# Altium integrated library Header-254mm.IntLib: 172 symbols
Pins are listed as number, name and electrical type; pins without a type are passive.

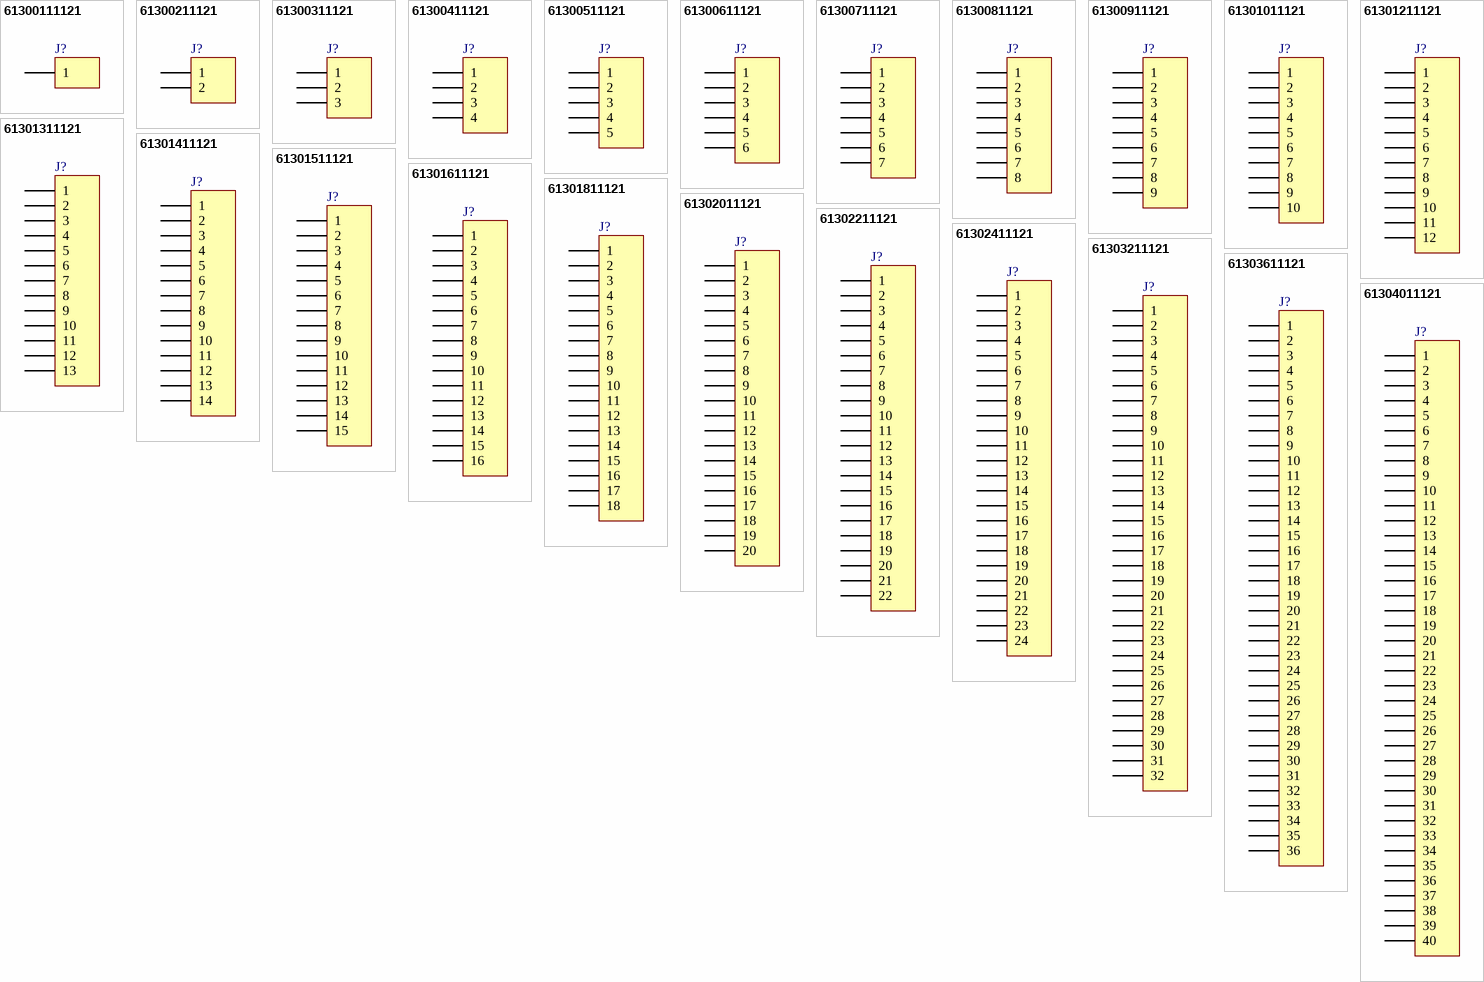
[diagram p0: symbols 61300111121 to 61304011121]

## 61300111121
designator J?, comment 01p  (value not drawn)
WR-PHD 2.54 mm THT Pin Header, 01p; Part Number: 61300111121; Vendor: Wurth Elektronik; Value: 01p
footprint 61300111121
pins: 1

## 61300211121
designator J?, comment 02p  (value not drawn)
WR-PHD 2.54 mm THT Pin Header, 02p; Part Number: 61300211121; Vendor: Wurth Elektronik; Value: 02p
footprint 61300211121
pins: 1, 2

## 61300311121
designator J?, comment 03p  (value not drawn)
WR-PHD 2.54 mm THT Pin Header, 03p; Part Number: 61300311121; Vendor: Wurth Elektronik; Value: 03p
footprint 61300311121
pins: 1, 2, 3

## 61300411121
designator J?, comment 04p  (value not drawn)
WR-PHD 2.54 mm THT Pin Header, 04p; Part Number: 61300411121; Vendor: Wurth Elektronik; Value: 04p
footprint 61300411121
pins: 1, 2, 3, 4

## 61300511121
designator J?, comment 05p  (value not drawn)
WR-PHD 2.54 mm THT Pin Header, 05p; Part Number: 61300511121; Vendor: Wurth Elektronik; Value: 05p
footprint 61300511121
pins: 1, 2, 3, 4, 5

## 61300611121
designator J?, comment 06p  (value not drawn)
WR-PHD 2.54 mm THT Pin Header, 06p; Part Number: 61300611121; Vendor: Wurth Elektronik; Value: 06p
footprint 61300611121
pins: 1, 2, 3, 4, 5, 6

## 61300711121
designator J?, comment 07p  (value not drawn)
WR-PHD 2.54 mm THT Pin Header, 07p; Part Number: 61300711121; Vendor: Wurth Elektronik; Value: 07p
footprint 61300711121
pins: 1, 2, 3, 4, 5, 6, 7

## 61300811121
designator J?, comment 08p  (value not drawn)
WR-PHD 2.54 mm THT Pin Header, 08p; Part Number: 61300811121; Vendor: Wurth Elektronik; Value: 08p
footprint 61300811121
pins: 1, 2, 3, 4, 5, 6, 7, 8

## 61300911121
designator J?, comment 09p  (value not drawn)
WR-PHD 2.54 mm THT Pin Header, 09p; Part Number: 61300911121; Vendor: Wurth Elektronik; Value: 09p
footprint 61300911121
pins: 1, 2, 3, 4, 5, 6, 7, 8, 9

## 61301011121
designator J?, comment 10p  (value not drawn)
WR-PHD 2.54 mm THT Pin Header, 10p; Part Number: 61301011121; Vendor: Wurth Elektronik; Value: 10p
footprint 61301011121
pins: 1, 2, 3, 4, 5, 6, 7, 8, 9, 10

## 61301211121
designator J?, comment 12p  (value not drawn)
WR-PHD 2.54 mm THT Pin Header, 12p; Part Number: 61301211121; Vendor: Wurth Elektronik; Value: 12p
footprint 61301211121
pins: 1, 2, 3, 4, 5, 6, 7, 8, 9, 10, 11, 12

## 61301311121
designator J?, comment 13p  (value not drawn)
WR-PHD 2.54 mm THT Pin Header, 13p; Part Number: 61301311121; Vendor: Wurth Elektronik; Value: 13p
footprint 61301311121
pins: 1, 2, 3, 4, 5, 6, 7, 8, 9, 10, 11, 12, 13

## 61301411121
designator J?, comment 14p  (value not drawn)
WR-PHD 2.54 mm THT Pin Header, 14p; Part Number: 61301411121; Vendor: Wurth Elektronik; Value: 14p
footprint 61301411121
pins: 1, 2, 3, 4, 5, 6, 7, 8, 9, 10, 11, 12, 13, 14

## 61301511121
designator J?, comment 15p  (value not drawn)
WR-PHD 2.54 mm THT Pin Header, 15p; Part Number: 61301511121; Vendor: Wurth Elektronik; Value: 15p
footprint 61301511121
pins: 1, 2, 3, 4, 5, 6, 7, 8, 9, 10, 11, 12, 13, 14, 15

## 61301611121
designator J?, comment 16p  (value not drawn)
WR-PHD 2.54 mm THT Pin Header, 16p; Part Number: 61301611121; Vendor: Wurth Elektronik; Value: 16p
footprint 61301611121
pins: 1, 2, 3, 4, 5, 6, 7, 8, 9, 10, 11, 12, 13, 14, 15, 16

## 61301811121
designator J?, comment 18p  (value not drawn)
WR-PHD 2.54 mm THT Pin Header, 18p; Part Number: 61301811121; Vendor: Wurth Elektronik; Value: 18p
footprint 61301811121
pins: 1, 2, 3, 4, 5, 6, 7, 8, 9, 10, 11, 12, 13, 14, 15, 16, 17, 18

## 61302011121
designator J?, comment 20p  (value not drawn)
WR-PHD 2.54 mm THT Pin Header, 20p; Part Number: 61302011121; Vendor: Wurth Elektronik; Value: 20p
footprint 61302011121
pins: 1, 2, 3, 4, 5, 6, 7, 8, 9, 10, 11, 12, 13, 14, 15, 16, 17, 18, 19, 20

## 61302211121
designator J?, comment 22p  (value not drawn)
WR-PHD 2.54 mm THT Pin Header, 22p; Part Number: 61302211121; Vendor: Wurth Elektronik; Value: 22p
footprint 61302211121
pins: 1, 2, 3, 4, 5, 6, 7, 8, 9, 10, 11, 12, 13, 14, 15, 16, 17, 18, 19, 20, 21, 22

## 61302411121
designator J?, comment 24p  (value not drawn)
WR-PHD 2.54 mm THT Pin Header, 24p; Part Number: 61302411121; Vendor: Wurth Elektronik; Value: 24p
footprint 61302411121
pins: 1, 2, 3, 4, 5, 6, 7, 8, 9, 10, 11, 12, 13, 14, 15, 16, 17, 18, 19, 20, 21, 22, 23, 24

## 61303211121
designator J?, comment 32p  (value not drawn)
WR-PHD 2.54 mm THT Pin Header, 32p; Part Number: 61303211121; Vendor: Wurth Elektronik; Value: 32p
footprint 61303211121
pins: 1, 2, 3, 4, 5, 6, 7, 8, 9, 10, 11, 12, 13, 14, 15, 16, 17, 18, 19, 20, 21, 22, 23, 24, 25, 26, 27, 28, 29, 30, 31, 32

## 61303611121
designator J?, comment 36p  (value not drawn)
WR-PHD 2.54 mm THT Pin Header, 36p; Part Number: 61303611121; Vendor: Wurth Elektronik; Value: 36p
footprint 61303611121
pins: 1, 2, 3, 4, 5, 6, 7, 8, 9, 10, 11, 12, 13, 14, 15, 16, 17, 18, 19, 20, 21, 22, 23, 24, 25, 26, 27, 28, 29, 30, 31, 32, 33, 34, 35, 36

## 61304011121
designator J?, comment 40p  (value not drawn)
WR-PHD 2.54 mm THT Pin Header, 40p; Part Number: 61304011121; Vendor: Wurth Elektronik; Value: 40p
footprint 61304011121
pins: 1, 2, 3, 4, 5, 6, 7, 8, 9, 10, 11, 12, 13, 14, 15, 16, 17, 18, 19, 20, 21, 22, 23, 24, 25, 26, 27, 28, 29, 30, 31, 32, 33, 34, 35, 36, 37, 38, 39, 40


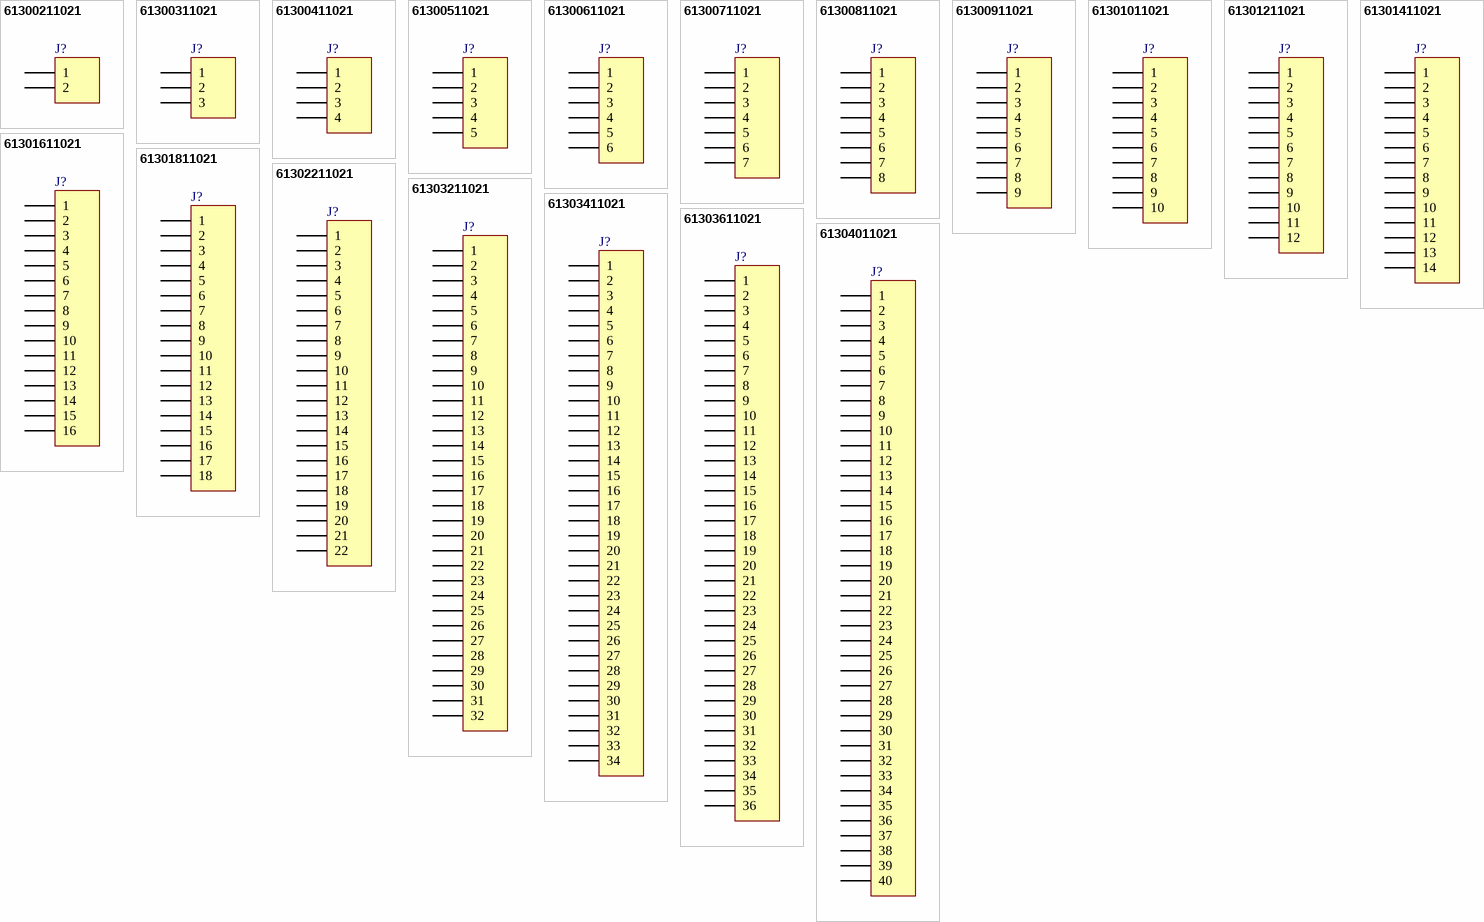
[diagram p1: symbols 61300211021 to 61304011021]

## 61300211021
designator J?, comment 02p  (value not drawn)
WR-PHD 2.54 mm THT Angled Pin Header, 02p; Part Number: 61300211021; Vendor: Wurth Elektronik; Value: 02p
footprint 61300211021
pins: 1, 2

## 61300311021
designator J?, comment 03p  (value not drawn)
WR-PHD 2.54 mm THT Angled Pin Header, 03p; Part Number: 61300311021; Vendor: Wurth Elektronik; Value: 03p
footprint 61300311021
pins: 1, 2, 3

## 61300411021
designator J?, comment 04p  (value not drawn)
WR-PHD 2.54 mm THT Angled Pin Header, 04p; Part Number: 61300411021; Vendor: Wurth Elektronik; Value: 04p
footprint 61300411021
pins: 1, 2, 3, 4

## 61300511021
designator J?, comment 05p  (value not drawn)
WR-PHD 2.54 mm THT Angled Pin Header, 05p; Part Number: 61300511021; Vendor: Wurth Elektronik; Value: 05p
footprint 61300511021
pins: 1, 2, 3, 4, 5

## 61300611021
designator J?, comment 06p  (value not drawn)
WR-PHD 2.54 mm THT Angled Pin Header, 06p; Part Number: 61300611021; Vendor: Wurth Elektronik; Value: 06p
footprint 61300611021
pins: 1, 2, 3, 4, 5, 6

## 61300711021
designator J?, comment 07p  (value not drawn)
WR-PHD 2.54 mm THT Angled Pin Header, 07p; Part Number: 61300711021; Vendor: Wurth Elektronik; Value: 07p
footprint 61300711021
pins: 1, 2, 3, 4, 5, 6, 7

## 61300811021
designator J?, comment 08p  (value not drawn)
WR-PHD 2.54 mm THT Angled Pin Header, 08p; Part Number: 61300811021; Vendor: Wurth Elektronik; Value: 08p
footprint 61300811021
pins: 1, 2, 3, 4, 5, 6, 7, 8

## 61300911021
designator J?, comment 09p  (value not drawn)
WR-PHD 2.54 mm THT Angled Pin Header, 09p; Part Number: 61300911021; Vendor: Wurth Elektronik; Value: 09p
footprint 61300911021
pins: 1, 2, 3, 4, 5, 6, 7, 8, 9

## 61301011021
designator J?, comment 10p  (value not drawn)
WR-PHD 2.54 mm THT Angled Pin Header, 10p; Part Number: 61301011021; Vendor: Wurth Elektronik; Value: 10p
footprint 61301011021
pins: 1, 2, 3, 4, 5, 6, 7, 8, 9, 10

## 61301211021
designator J?, comment 12p  (value not drawn)
WR-PHD 2.54 mm THT Angled Pin Header, 12p; Part Number: 61301211021; Vendor: Wurth Elektronik; Value: 12p
footprint 61301211021
pins: 1, 2, 3, 4, 5, 6, 7, 8, 9, 10, 11, 12

## 61301411021
designator J?, comment 14p  (value not drawn)
WR-PHD 2.54 mm THT Angled Pin Header, 14p; Part Number: 61301411021; Vendor: Wurth Elektronik; Value: 14p
footprint 61301411021
pins: 1, 2, 3, 4, 5, 6, 7, 8, 9, 10, 11, 12, 13, 14

## 61301611021
designator J?, comment 16p  (value not drawn)
WR-PHD 2.54 mm THT Angled Pin Header, 16p; Part Number: 61301611021; Vendor: Wurth Elektronik; Value: 16p
footprint 61301611021
pins: 1, 2, 3, 4, 5, 6, 7, 8, 9, 10, 11, 12, 13, 14, 15, 16

## 61301811021
designator J?, comment 18p  (value not drawn)
WR-PHD 2.54 mm THT Angled Pin Header, 18p; Part Number: 61301811021; Vendor: Wurth Elektronik; Value: 18p
footprint 61301811021
pins: 1, 2, 3, 4, 5, 6, 7, 8, 9, 10, 11, 12, 13, 14, 15, 16, 17, 18

## 61302211021
designator J?, comment 22p  (value not drawn)
WR-PHD 2.54 mm THT Angled Pin Header, 22p; Part Number: 61302211021; Vendor: Wurth Elektronik; Value: 22p
footprint 61302211021
pins: 1, 2, 3, 4, 5, 6, 7, 8, 9, 10, 11, 12, 13, 14, 15, 16, 17, 18, 19, 20, 21, 22

## 61303211021
designator J?, comment 32p  (value not drawn)
WR-PHD 2.54 mm THT Angled Pin Header, 32p; Part Number: 61303211021; Vendor: Wurth Elektronik; Value: 32p
footprint 61303211021
pins: 1, 2, 3, 4, 5, 6, 7, 8, 9, 10, 11, 12, 13, 14, 15, 16, 17, 18, 19, 20, 21, 22, 23, 24, 25, 26, 27, 28, 29, 30, 31, 32

## 61303411021
designator J?, comment 34p  (value not drawn)
WR-PHD 2.54 mm THT Angled Pin Header, 34p; Part Number: 61303411021; Vendor: Wurth Elektronik; Value: 34p
footprint 61303411021
pins: 1, 2, 3, 4, 5, 6, 7, 8, 9, 10, 11, 12, 13, 14, 15, 16, 17, 18, 19, 20, 21, 22, 23, 24, 25, 26, 27, 28, 29, 30, 31, 32, 33, 34

## 61303611021
designator J?, comment 36p  (value not drawn)
WR-PHD 2.54 mm THT Angled Pin Header, 36p; Part Number: 61303611021; Vendor: Wurth Elektronik; Value: 36p
footprint 61303611021
pins: 1, 2, 3, 4, 5, 6, 7, 8, 9, 10, 11, 12, 13, 14, 15, 16, 17, 18, 19, 20, 21, 22, 23, 24, 25, 26, 27, 28, 29, 30, 31, 32, 33, 34, 35, 36

## 61304011021
designator J?, comment 40p  (value not drawn)
WR-PHD 2.54 mm THT Angled Pin Header, 40p; Part Number: 61304011021; Vendor: Wurth Elektronik; Value: 40p
footprint 61304011021
pins: 1, 2, 3, 4, 5, 6, 7, 8, 9, 10, 11, 12, 13, 14, 15, 16, 17, 18, 19, 20, 21, 22, 23, 24, 25, 26, 27, 28, 29, 30, 31, 32, 33, 34, 35, 36, 37, 38, 39, 40


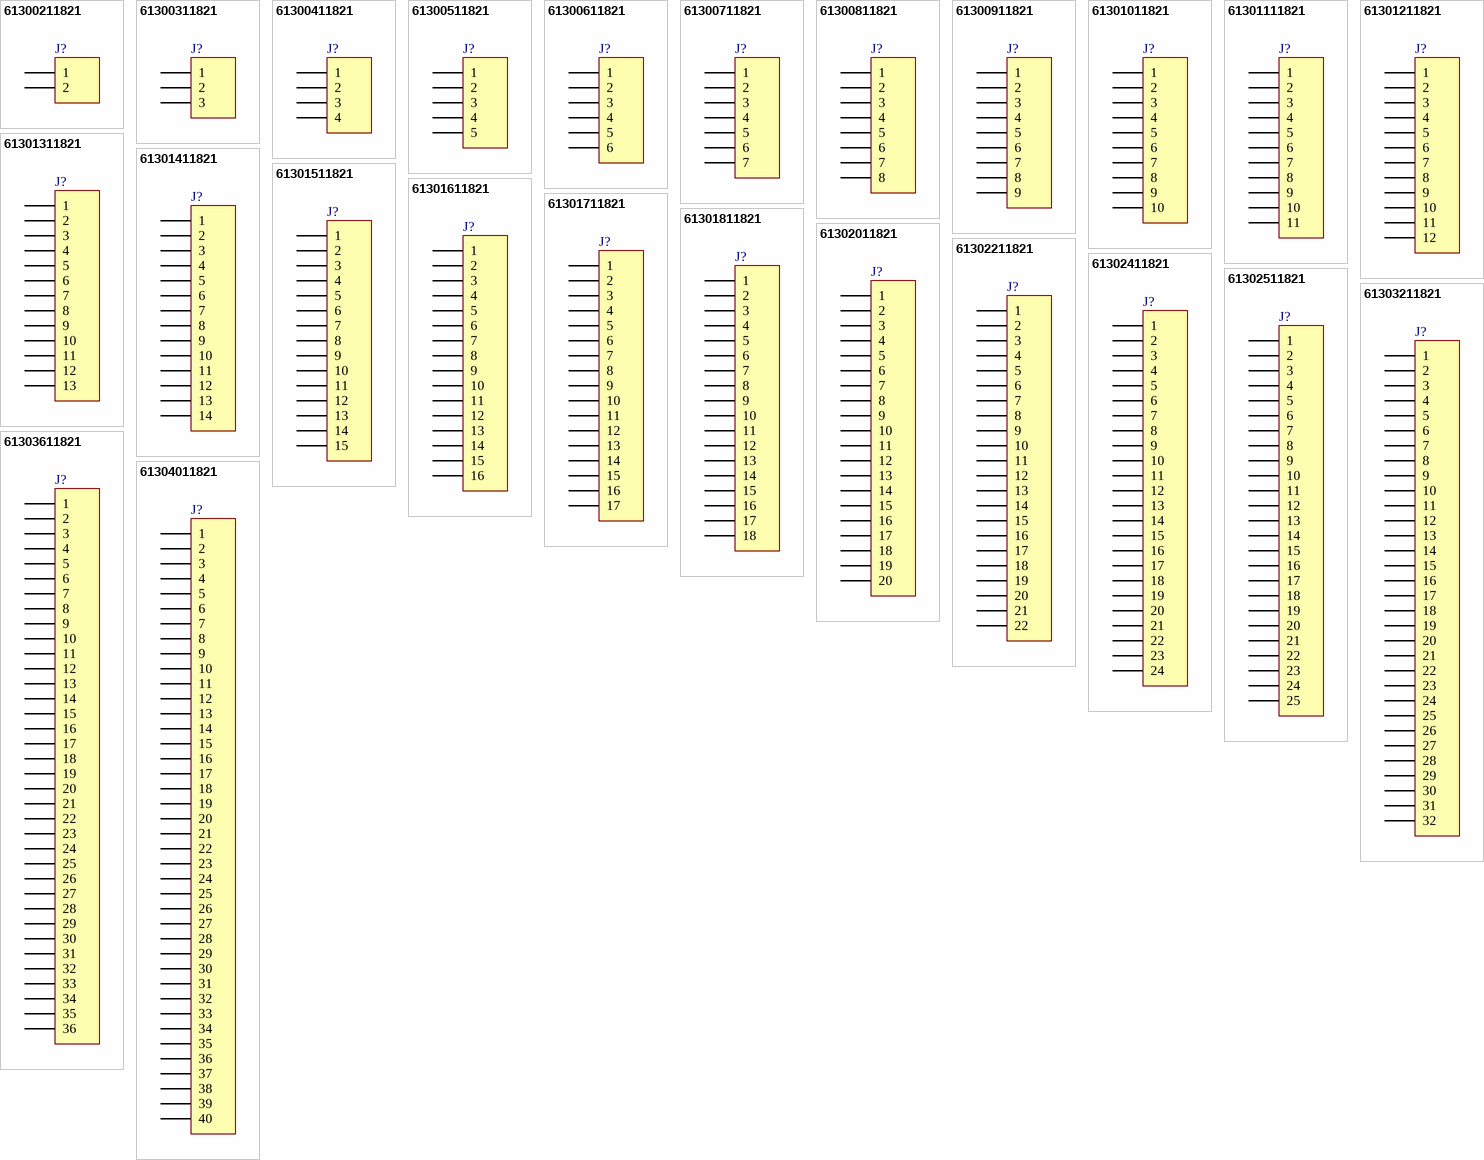
[diagram p2: symbols 61300211821 to 61304011821]

## 61300211821
designator J?, comment 02p  (value not drawn)
WR-PHD 2.54 mm Socket Header, 02p; Part Number: 61300211821; Vendor: Wurth Elektronik; Value: 02p
footprint 61300211821
pins: 1, 2

## 61300311821
designator J?, comment 03p  (value not drawn)
WR-PHD 2.54 mm Socket Header, 03p; Part Number: 61300311821; Vendor: Wurth Elektronik; Value: 03p
footprint 61300311821
pins: 1, 2, 3

## 61300411821
designator J?, comment 04p  (value not drawn)
WR-PHD 2.54 mm Socket Header, 04p; Part Number: 61300411821; Vendor: Wurth Elektronik; Value: 04p
footprint 61300411821
pins: 1, 2, 3, 4

## 61300511821
designator J?, comment 05p  (value not drawn)
WR-PHD 2.54 mm Socket Header, 05p; Part Number: 61300511821; Vendor: Wurth Elektronik; Value: 05p
footprint 61300511821
pins: 1, 2, 3, 4, 5

## 61300611821
designator J?, comment 06p  (value not drawn)
WR-PHD 2.54 mm Socket Header, 06p; Part Number: 61300611821; Vendor: Wurth Elektronik; Value: 06p
footprint 61300611821
pins: 1, 2, 3, 4, 5, 6

## 61300711821
designator J?, comment 07p  (value not drawn)
WR-PHD 2.54 mm Socket Header, 07p; Part Number: 61300711821; Vendor: Wurth Elektronik; Value: 07p
footprint 61300711821
pins: 1, 2, 3, 4, 5, 6, 7

## 61300811821
designator J?, comment 08p  (value not drawn)
WR-PHD 2.54 mm Socket Header, 08p; Part Number: 61300811821; Vendor: Wurth Elektronik; Value: 08p
footprint 61300811821
pins: 1, 2, 3, 4, 5, 6, 7, 8

## 61300911821
designator J?, comment 09p  (value not drawn)
WR-PHD 2.54 mm Socket Header, 09p; Part Number: 61300911821; Vendor: Wurth Elektronik; Value: 09p
footprint 61300911821
pins: 1, 2, 3, 4, 5, 6, 7, 8, 9

## 61301011821
designator J?, comment 10p  (value not drawn)
WR-PHD 2.54 mm Socket Header, 10p; Part Number: 61301011821; Vendor: Wurth Elektronik; Value: 10p
footprint 61301011821
pins: 1, 2, 3, 4, 5, 6, 7, 8, 9, 10

## 61301111821
designator J?, comment 11p  (value not drawn)
WR-PHD 2.54 mm Socket Header, 11p; Part Number: 61301111821; Vendor: Wurth Elektronik; Value: 11p
footprint 61301111821
pins: 1, 2, 3, 4, 5, 6, 7, 8, 9, 10, 11

## 61301211821
designator J?, comment 12p  (value not drawn)
WR-PHD 2.54 mm Socket Header, 12p; Part Number: 61301211821; Vendor: Wurth Elektronik; Value: 12p
footprint 61301211821
pins: 1, 2, 3, 4, 5, 6, 7, 8, 9, 10, 11, 12

## 61301311821
designator J?, comment 13p  (value not drawn)
WR-PHD 2.54 mm Socket Header, 13p; Part Number: 61301311821; Vendor: Wurth Elektronik; Value: 13p
footprint 61301311821
pins: 1, 2, 3, 4, 5, 6, 7, 8, 9, 10, 11, 12, 13

## 61301411821
designator J?, comment 14p  (value not drawn)
WR-PHD 2.54 mm Socket Header, 14p; Part Number: 61301411821; Vendor: Wurth Elektronik; Value: 14p
footprint 61301411821
pins: 1, 2, 3, 4, 5, 6, 7, 8, 9, 10, 11, 12, 13, 14

## 61301511821
designator J?, comment 15p  (value not drawn)
WR-PHD 2.54 mm Socket Header, 15p; Part Number: 61301511821; Vendor: Wurth Elektronik; Value: 15p
footprint 61301511821
pins: 1, 2, 3, 4, 5, 6, 7, 8, 9, 10, 11, 12, 13, 14, 15

## 61301611821
designator J?, comment 16p  (value not drawn)
WR-PHD 2.54 mm Socket Header, 16p; Part Number: 61301611821; Vendor: Wurth Elektronik; Value: 16p
footprint 61301611821
pins: 1, 2, 3, 4, 5, 6, 7, 8, 9, 10, 11, 12, 13, 14, 15, 16

## 61301711821
designator J?, comment 17p  (value not drawn)
WR-PHD 2.54 mm Socket Header, 17p; Part Number: 61301711821; Vendor: Wurth Elektronik; Value: 17p
footprint 61301711821
pins: 1, 2, 3, 4, 5, 6, 7, 8, 9, 10, 11, 12, 13, 14, 15, 16, 17

## 61301811821
designator J?, comment 18p  (value not drawn)
WR-PHD 2.54 mm Socket Header, 18p; Part Number: 61301811821; Vendor: Wurth Elektronik; Value: 18p
footprint 61301811821
pins: 1, 2, 3, 4, 5, 6, 7, 8, 9, 10, 11, 12, 13, 14, 15, 16, 17, 18

## 61302011821
designator J?, comment 20p  (value not drawn)
WR-PHD 2.54 mm Socket Header, 20p; Part Number: 61302011821; Vendor: Wurth Elektronik; Value: 20p
footprint 61302011821
pins: 1, 2, 3, 4, 5, 6, 7, 8, 9, 10, 11, 12, 13, 14, 15, 16, 17, 18, 19, 20

## 61302211821
designator J?, comment 22p  (value not drawn)
WR-PHD 2.54 mm Socket Header, 22p; Part Number: 61302211821; Vendor: Wurth Elektronik; Value: 22p
footprint 61302211821
pins: 1, 2, 3, 4, 5, 6, 7, 8, 9, 10, 11, 12, 13, 14, 15, 16, 17, 18, 19, 20, 21, 22

## 61302411821
designator J?, comment 24p  (value not drawn)
WR-PHD 2.54 mm Socket Header, 24p; Part Number: 61302411821; Vendor: Wurth Elektronik; Value: 24p
footprint 61302411821
pins: 1, 2, 3, 4, 5, 6, 7, 8, 9, 10, 11, 12, 13, 14, 15, 16, 17, 18, 19, 20, 21, 22, 23, 24

## 61302511821
designator J?, comment 25p  (value not drawn)
WR-PHD 2.54 mm Socket Header, 25p; Part Number: 61302511821; Vendor: Wurth Elektronik; Value: 25p
footprint 61302511821
pins: 1, 2, 3, 4, 5, 6, 7, 8, 9, 10, 11, 12, 13, 14, 15, 16, 17, 18, 19, 20, 21, 22, 23, 24, 25

## 61303211821
designator J?, comment 32p  (value not drawn)
WR-PHD 2.54 mm Socket Header, 32p; Part Number: 61303211821; Vendor: Wurth Elektronik; Value: 32p
footprint 61303211821
pins: 1, 2, 3, 4, 5, 6, 7, 8, 9, 10, 11, 12, 13, 14, 15, 16, 17, 18, 19, 20, 21, 22, 23, 24, 25, 26, 27, 28, 29, 30, 31, 32

## 61303611821
designator J?, comment 36p  (value not drawn)
WR-PHD 2.54 mm Socket Header, 36p; Part Number: 61303611821; Vendor: Wurth Elektronik; Value: 36p
footprint 61303611821
pins: 1, 2, 3, 4, 5, 6, 7, 8, 9, 10, 11, 12, 13, 14, 15, 16, 17, 18, 19, 20, 21, 22, 23, 24, 25, 26, 27, 28, 29, 30, 31, 32, 33, 34, 35, 36

## 61304011821
designator J?, comment 40p  (value not drawn)
WR-PHD 2.54 mm Socket Header, 40p; Part Number: 61304011821; Vendor: Wurth Elektronik; Value: 40p
footprint 61304011821
pins: 1, 2, 3, 4, 5, 6, 7, 8, 9, 10, 11, 12, 13, 14, 15, 16, 17, 18, 19, 20, 21, 22, 23, 24, 25, 26, 27, 28, 29, 30, 31, 32, 33, 34, 35, 36, 37, 38, 39, 40


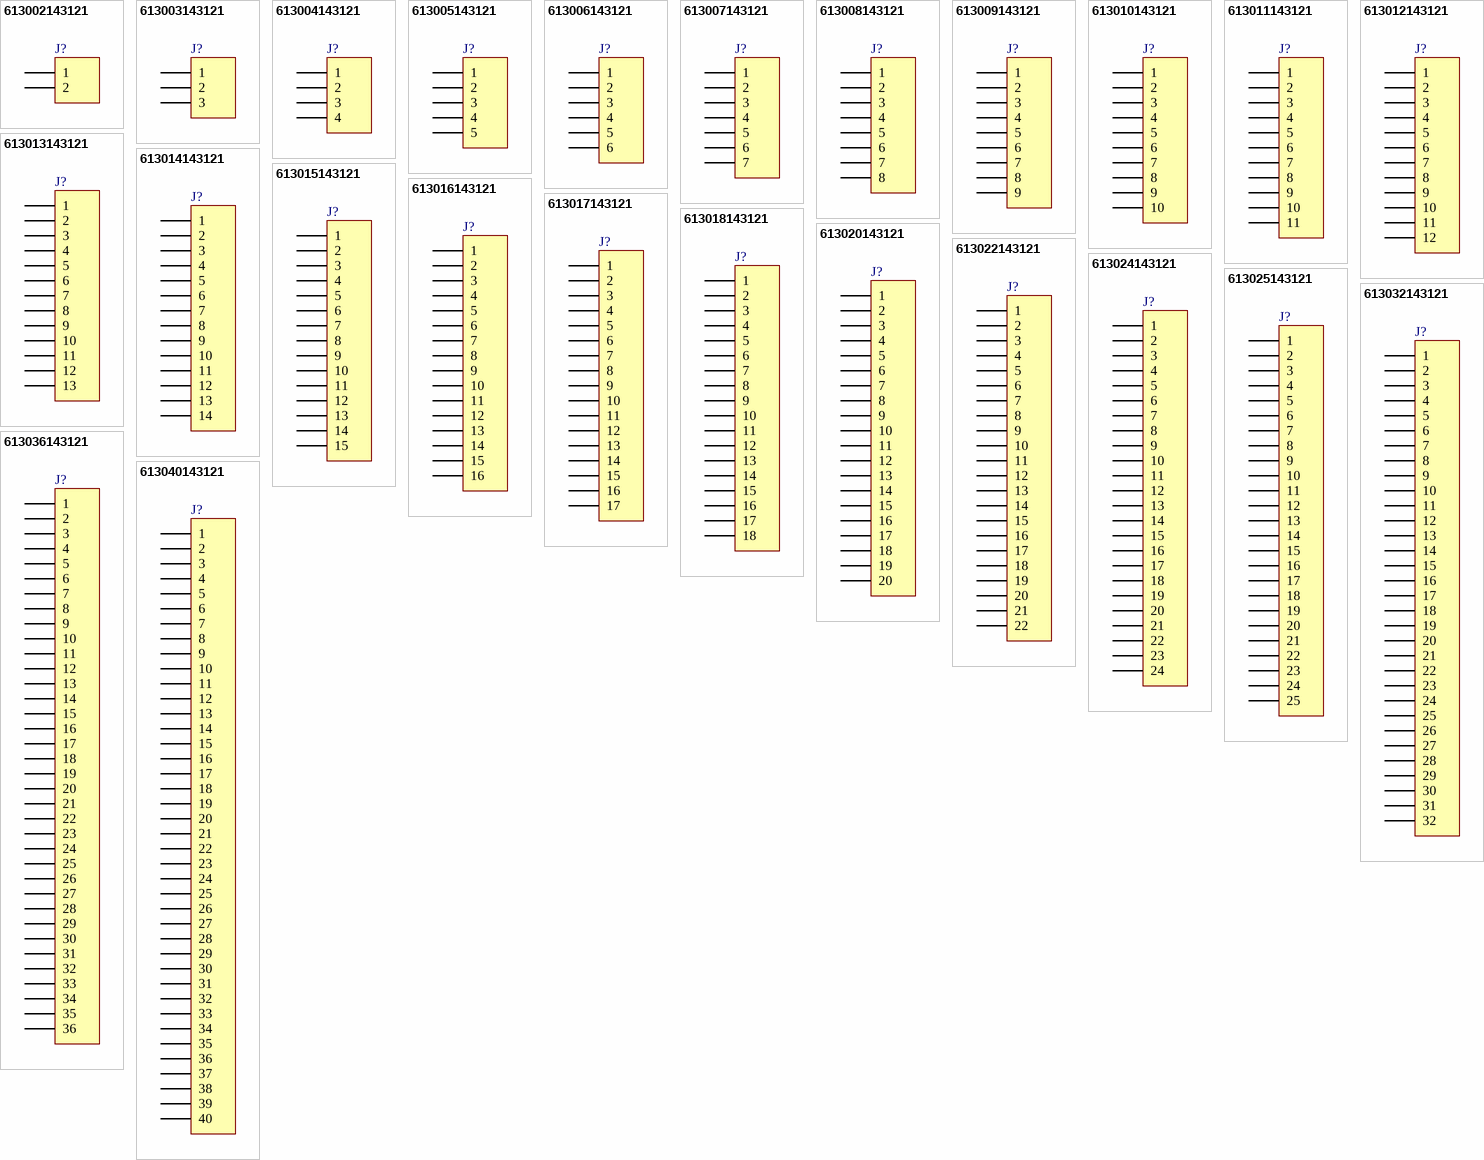
[diagram p3: symbols 613002143121 to 613040143121]

## 613002143121
designator J?, comment 02p  (value not drawn)
WR-PHD 2.54 mm Angled Socket Header, 02p; Part Number: 613002143121; Vendor: Wurth Elektronik; Value: 02p
footprint 613002143121
pins: 1, 2

## 613003143121
designator J?, comment 03p  (value not drawn)
WR-PHD 2.54 mm Angled Socket Header, 03p; Part Number: 613003143121; Vendor: Wurth Elektronik; Value: 03p
footprint 613003143121
pins: 1, 2, 3

## 613004143121
designator J?, comment 04p  (value not drawn)
WR-PHD 2.54 mm Angled Socket Header, 04p; Part Number: 613004143121; Vendor: Wurth Elektronik; Value: 04p
footprint 613004143121
pins: 1, 2, 3, 4

## 613005143121
designator J?, comment 05p  (value not drawn)
WR-PHD 2.54 mm Angled Socket Header, 05p; Part Number: 613005143121; Vendor: Wurth Elektronik; Value: 05p
footprint 613005143121
pins: 1, 2, 3, 4, 5

## 613006143121
designator J?, comment 06p  (value not drawn)
WR-PHD 2.54 mm Angled Socket Header, 06p; Part Number: 613006143121; Vendor: Wurth Elektronik; Value: 06p
footprint 613006143121
pins: 1, 2, 3, 4, 5, 6

## 613007143121
designator J?, comment 07p  (value not drawn)
WR-PHD 2.54 mm Angled Socket Header, 07p; Part Number: 613007143121; Vendor: Wurth Elektronik; Value: 07p
footprint 613007143121
pins: 1, 2, 3, 4, 5, 6, 7

## 613008143121
designator J?, comment 08p  (value not drawn)
WR-PHD 2.54 mm Angled Socket Header, 08p; Part Number: 613008143121; Vendor: Wurth Elektronik; Value: 08p
footprint 613008143121
pins: 1, 2, 3, 4, 5, 6, 7, 8

## 613009143121
designator J?, comment 09p  (value not drawn)
WR-PHD 2.54 mm Angled Socket Header, 09p; Part Number: 613009143121; Vendor: Wurth Elektronik; Value: 09p
footprint 613009143121
pins: 1, 2, 3, 4, 5, 6, 7, 8, 9

## 613010143121
designator J?, comment 10p  (value not drawn)
WR-PHD 2.54 mm Angled Socket Header, 10p; Part Number: 613010143121; Vendor: Wurth Elektronik; Value: 10p
footprint 613010143121
pins: 1, 2, 3, 4, 5, 6, 7, 8, 9, 10

## 613011143121
designator J?, comment 11p  (value not drawn)
WR-PHD 2.54 mm Angled Socket Header, 11p; Part Number: 613011143121; Vendor: Wurth Elektronik; Value: 11p
footprint 613011143121
pins: 1, 2, 3, 4, 5, 6, 7, 8, 9, 10, 11

## 613012143121
designator J?, comment 12p  (value not drawn)
WR-PHD 2.54 mm Angled Socket Header, 12p; Part Number: 613012143121; Vendor: Wurth Elektronik; Value: 12p
footprint 613012143121
pins: 1, 2, 3, 4, 5, 6, 7, 8, 9, 10, 11, 12

## 613013143121
designator J?, comment 13p  (value not drawn)
WR-PHD 2.54 mm Angled Socket Header, 13p; Part Number: 613013143121; Vendor: Wurth Elektronik; Value: 13p
footprint 613013143121
pins: 1, 2, 3, 4, 5, 6, 7, 8, 9, 10, 11, 12, 13

## 613014143121
designator J?, comment 14p  (value not drawn)
WR-PHD 2.54 mm Angled Socket Header, 14p; Part Number: 613014143121; Vendor: Wurth Elektronik; Value: 14p
footprint 613014143121
pins: 1, 2, 3, 4, 5, 6, 7, 8, 9, 10, 11, 12, 13, 14

## 613015143121
designator J?, comment 15p  (value not drawn)
WR-PHD 2.54 mm Angled Socket Header, 15p; Part Number: 613015143121; Vendor: Wurth Elektronik; Value: 15p
footprint 613015143121
pins: 1, 2, 3, 4, 5, 6, 7, 8, 9, 10, 11, 12, 13, 14, 15

## 613016143121
designator J?, comment 16p  (value not drawn)
WR-PHD 2.54 mm Angled Socket Header, 16p; Part Number: 613016143121; Vendor: Wurth Elektronik; Value: 16p
footprint 613016143121
pins: 1, 2, 3, 4, 5, 6, 7, 8, 9, 10, 11, 12, 13, 14, 15, 16

## 613017143121
designator J?, comment 17p  (value not drawn)
WR-PHD 2.54 mm Angled Socket Header, 17p; Part Number: 613017143121; Vendor: Wurth Elektronik; Value: 17p
footprint 613017143121
pins: 1, 2, 3, 4, 5, 6, 7, 8, 9, 10, 11, 12, 13, 14, 15, 16, 17

## 613018143121
designator J?, comment 18p  (value not drawn)
WR-PHD 2.54 mm Angled Socket Header, 18p; Part Number: 613018143121; Vendor: Wurth Elektronik; Value: 18p
footprint 613018143121
pins: 1, 2, 3, 4, 5, 6, 7, 8, 9, 10, 11, 12, 13, 14, 15, 16, 17, 18

## 613020143121
designator J?, comment 20p  (value not drawn)
WR-PHD 2.54 mm Angled Socket Header, 20p; Part Number: 613020143121; Vendor: Wurth Elektronik; Value: 20p
footprint 613020143121
pins: 1, 2, 3, 4, 5, 6, 7, 8, 9, 10, 11, 12, 13, 14, 15, 16, 17, 18, 19, 20

## 613022143121
designator J?, comment 22p  (value not drawn)
WR-PHD 2.54 mm Angled Socket Header, 22p; Part Number: 613022143121; Vendor: Wurth Elektronik; Value: 22p
footprint 613022143121
pins: 1, 2, 3, 4, 5, 6, 7, 8, 9, 10, 11, 12, 13, 14, 15, 16, 17, 18, 19, 20, 21, 22

## 613024143121
designator J?, comment 24p  (value not drawn)
WR-PHD 2.54 mm Angled Socket Header, 24p; Part Number: 613024143121; Vendor: Wurth Elektronik; Value: 24p
footprint 613024143121
pins: 1, 2, 3, 4, 5, 6, 7, 8, 9, 10, 11, 12, 13, 14, 15, 16, 17, 18, 19, 20, 21, 22, 23, 24

## 613025143121
designator J?, comment 25p  (value not drawn)
WR-PHD 2.54 mm Angled Socket Header, 25p; Part Number: 613025143121; Vendor: Wurth Elektronik; Value: 25p
footprint 613025143121
pins: 1, 2, 3, 4, 5, 6, 7, 8, 9, 10, 11, 12, 13, 14, 15, 16, 17, 18, 19, 20, 21, 22, 23, 24, 25

## 613032143121
designator J?, comment 32p  (value not drawn)
WR-PHD 2.54 mm Angled Socket Header, 32p; Part Number: 613032143121; Vendor: Wurth Elektronik; Value: 32p
footprint 613032143121
pins: 1, 2, 3, 4, 5, 6, 7, 8, 9, 10, 11, 12, 13, 14, 15, 16, 17, 18, 19, 20, 21, 22, 23, 24, 25, 26, 27, 28, 29, 30, 31, 32

## 613036143121
designator J?, comment 36p  (value not drawn)
WR-PHD 2.54 mm Angled Socket Header, 36p; Part Number: 613036143121; Vendor: Wurth Elektronik; Value: 36p
footprint 613036143121
pins: 1, 2, 3, 4, 5, 6, 7, 8, 9, 10, 11, 12, 13, 14, 15, 16, 17, 18, 19, 20, 21, 22, 23, 24, 25, 26, 27, 28, 29, 30, 31, 32, 33, 34, 35, 36

## 613040143121
designator J?, comment 40p  (value not drawn)
WR-PHD 2.54 mm Angled Socket Header, 40p; Part Number: 613040143121; Vendor: Wurth Elektronik; Value: 40p
footprint 613040143121
pins: 1, 2, 3, 4, 5, 6, 7, 8, 9, 10, 11, 12, 13, 14, 15, 16, 17, 18, 19, 20, 21, 22, 23, 24, 25, 26, 27, 28, 29, 30, 31, 32, 33, 34, 35, 36, 37, 38, 39, 40

